# Altium footprint library MyComponents_v2.5.PcbLib: 403 footprints (part 25 of 26)
Each footprint in its own frame and in the unit in brackets; x right, y up, seen from the top. Pads: shape width x height; smd on the part's side, far side on the other; paste and mask are expansions set on the pad; w line width, h text height; cw(c..) or ccw(c..) is an arc to the next point about the centre after c.
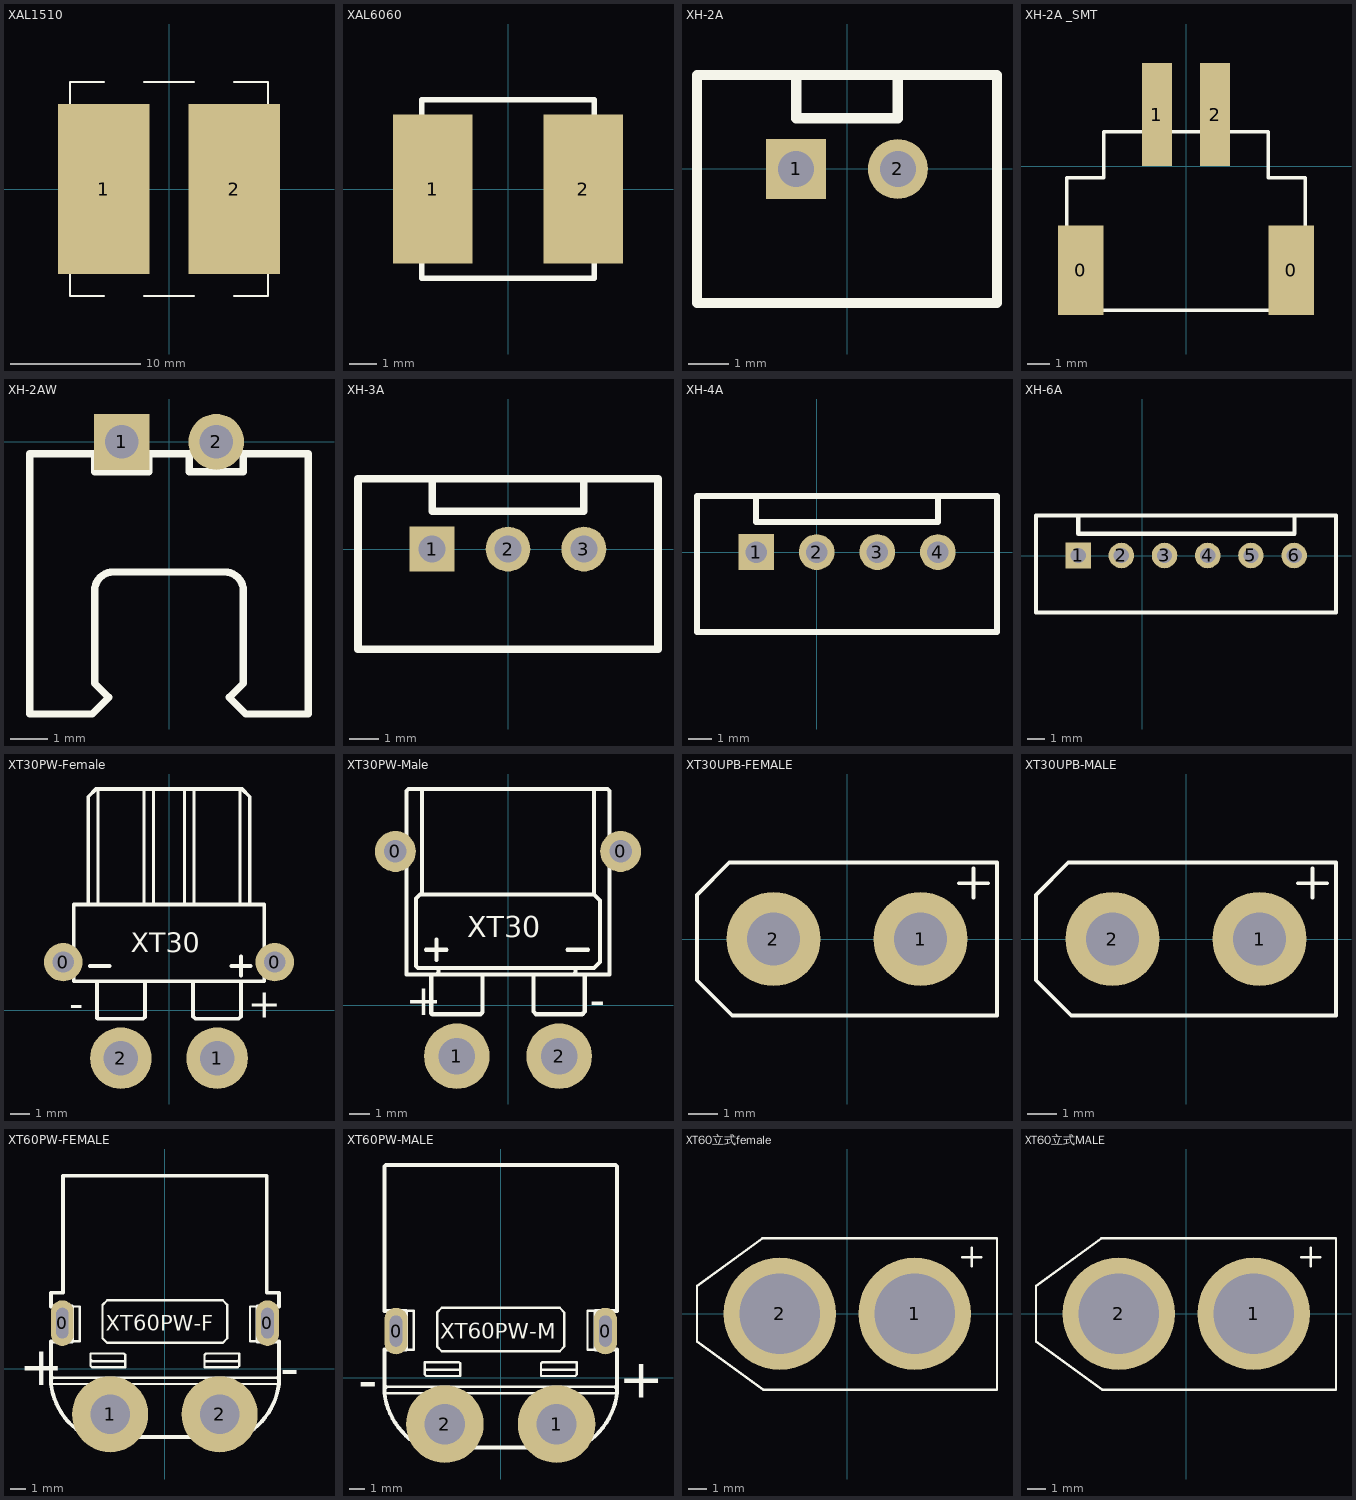
[diagram p24: the footprints below, top view; thin cyan lines are the x and y axes]

## XAL1510 [mm]
pads (2):
  rect 7x13 smd: 1(-5,0) 2(5,0)
Top Overlay:
  lines w0.152: -5,-8.2 -7.6,-8.2 -7.6,8.2 -5,8.2 ; -1.919,-8.2 1.919,-8.2 ; -1.919,8.2 1.919,8.2 ; 5,-8.2 7.6,-8.2 7.6,8.2 5,8.2
3D body "Coilcraft-XAL1510-103.step": height 10, standoff 0, extent -7.7,-8.2 7.7,8.2

## XAL6060 [mm]
pads (2):
  rect 2.93x5.5 smd: 1(-2.77,0) 2(2.77,0)
Top Overlay:
  lines w0.2: -3.18,-3.28 -3.18,3.28 3.18,3.28 3.18,-3.28 -3.18,-3.28
3D body "XAL6060.step": height 6, standoff -0.1, extent -3.28,-3.38 3.28,3.38

## XH-2A [mm] "2A,2.54mm"
pads (2):
  rect 1.5x1.5 hole 0.9: 1(-1.27,0)
  round 1.5 hole 0.9: 2(1.27,0)
Top Overlay:
  lines w0.254: -1.27,2.35 -1.27,1.27 1.27,1.27 1.27,2.35 ; -3.75,-3.35 3.75,-3.35 3.75,2.35 -3.75,2.35 -3.75,-3.35
3D body "XH2_54_2PIN.step": height 7.01, standoff -1.99, extent -4,-3.2 4,2.8

## XH-2A _SMT [mm] "2A,2.54mm smt"
pads (4):
  rect 2x3.9 smd: 0(-4.6,-4.55) 0(4.6,-4.55)
  rect 1.3x4.5 smd: 1(-1.27,2.25) 2(1.27,2.25)
Top Overlay:
  lines w0.15: -5.2,-6.3 -5.2,-0.5 -3.6,-0.5 -3.6,1.5 0,1.5 3.6,1.5 3.6,-0.5 5.2,-0.5 5.2,-6.3 0,-6.3 -5.2,-6.3
3D body "XH2.54AWR-2P.STEP": height 6.13, standoff -0.03, extent -4.9,-6.275 5.1,4.065

## XH-2AW [mm] "2A,2.54mm"
pads (2):
  rect 1.5x1.5 hole 0.9: 1(-1.27,0)
  round 1.5 hole 0.9: 2(1.27,0)
Top Overlay:
  lines w0.2: -2,-0.35 -2,-0.8 -0.775,-0.8 -0.55,-0.8 -0.55,-0.325 0,-0.325 0.55,-0.325 0.55,-0.8 0.775,-0.8 2,-0.8 2,-0.35 ; -1.955,-0.32 -3.75,-0.32 -3.75,-7.32 -2.07,-7.32 -1.625,-6.875 -2,-6.5 ; 1.955,-0.32 3.75,-0.32 3.75,-7.32 2.07,-7.32 1.625,-6.875 2,-6.5 ; -2,-6.5 -2,-4 cw(c-1.5,-4) -1.5,-3.5 0.5,-3.5 1.5,-3.5 cw(c1.5,-4) 2,-4 2,-6.5 ; -2,-6.5 -2,-6.5 ; -2,-6.5 -2,-6.5 ; 2,-6.5 2,-6.5 ; 2,-6.5 2,-6.5

## XH-3A [mm] "3A,2.54mm"
pads (3):
  rect 1.5x1.5 hole 0.9: 1(-2.54,0)
  round 1.5 hole 0.9: 2(0,0) 3(2.54,0)
Top Overlay:
  lines w0.254: -2.54,2.35 -2.54,1.27 2.54,1.27 2.54,2.35 ; -5.02,-3.35 5.02,-3.35 5.02,2.35 -5.02,2.35 -5.02,-3.35

## XH-4A [mm] "4A,2.54mm"
pads (4):
  rect 1.5x1.5 hole 0.9: 1(-2.54,0)
  round 1.5 hole 0.9: 2(0,0) 3(2.54,0) 4(5.08,0)
Top Overlay:
  lines w0.254: -2.54,2.35 -2.54,1.27 5.08,1.27 5.08,2.35 ; -5.02,-3.35 7.56,-3.35 7.56,2.35 -5.02,2.35 -5.02,-3.35

## XH-6A [mm]
pads (6):
  rect 1.5x1.5 hole 0.9: 1(-3.759,0.025)
  round 1.5 hole 0.9: 2(-1.219,0.025) 3(1.321,0.025) 4(3.861,0.025) 5(6.401,0.025) 6(8.941,0.025)
Top Overlay:
  lines w0.254: -3.759,2.375 -3.759,1.295 8.966,1.295 8.966,2.375 ; -6.239,-3.325 11.405,-3.325 11.405,2.375 -6.239,2.375 -6.239,-3.325

## XT30PW-Female [mm] "XT30卧式母头插座"
height 5
pads (4):
  round 2 hole 1.1: 0(-5.5,2.5) 0(5.5,2.5)
  round 3.2 hole 1.8: 1(2.5,-2.5) 2(-2.5,-2.5)
Top Overlay:
  lines w0.15: -3.7,5.5 -3.7,11.5 ; -1.3,5.6 -1.3,11.5 ; -0.8,5.5 -0.8,11.5 ; 0.8,5.5 0.8,11.5 ; 1.3,5.5 1.3,11.5 ; 3.6,11.5 3.7,11.4 3.7,5.5
  lines w0.2: -4.2,5.5 -4.2,11.1 -3.8,11.5 3.8,11.5 4.2,11.1 4.2,5.5 ; -4.1,2.3 -3.1,2.3 ; -3.75,1.5 -3.75,-0.4 -3.7,-0.45 -1.35,-0.45 -1.25,-0.35 -1.25,1.5 ; 1.25,1.4 1.25,-0.325 1.375,-0.45 3.625,-0.45 3.75,-0.325 3.75,1.5 ; 3.25,2.3 4.25,2.3 ; 3.75,1.8 3.75,2.8 ; -4.95,1.5 -4.95,5.5 4.95,5.5 4.95,1.5 -4.95,1.5
  text "+" at 4.1,-0.4 h1.52
  text "-" at -5.2,-0.4 h1.52
  text "XT30" at -2,3 h1.02
3D body "XT30PW-F-.step": height 5, standoff -2, extent -6.65,-3.575 6.65,11.325

## XT30PW-Male [mm] "XT30卧式公头插座"
height 5
pads (4):
  round 2 hole 1.1: 0(-5.5,7.5) 0(5.5,7.5)
  round 3.2 hole 1.8: 1(-2.5,-2.5) 2(2.5,-2.5)
Top Overlay:
  lines w0.2: -4.2,5.4 -4.2,10.55 ; -4,2.7 -3,2.7 ; -3.75,1.5 -3.75,-0.4 -3.7,-0.45 -1.35,-0.45 -1.25,-0.35 -1.25,1.5 ; -3.5,1.5 -3.4,1.6 -3.4,1.8 ; -3.5,2.2 -3.5,3.2 ; 1.25,1.4 1.25,-0.325 1.375,-0.45 3.625,-0.45 3.75,-0.325 3.75,1.5 ; 2.9,2.7 3.9,2.7 ; 3.2,1.5 3.3,1.6 3.3,1.8 ; 4.2,5.5 4.2,10.55 ; -4.95,1.5 -4.95,10.45 -4.85,10.55 4.85,10.55 4.95,10.45 4.95,1.5 -4.95,1.5 ; -4.5,1.9 -4.5,5.2 -4.3,5.4 4.2,5.4 4.5,5.1 4.5,2.1 4.2,1.8 -4.4,1.8 -4.5,1.9
  text "-" at 4,-0.5 h1.52
  text "+" at -5,-0.5 h1.52
  text "XT30" at -2,3.3 h1.02
3D body "XT30PW-M-.step": height 5, standoff -2, extent -6.65,-3.4 6.65,10.55

## XT30UPB-FEMALE [mm]
pads (2):
  round 3.2 hole 1.8: 1(2.5,0) 2(-2.5,0)
Top Overlay:
  lines w0.127: 3.8,1.9 4.8,1.9 ; 4.3,1.4 4.3,2.4 ; -5.1,-1.4 -5.1,1.5 -4,2.6 5.1,2.6 5.1,-2.6 -3.9,-2.6 -5.1,-1.4
3D body "XT30UPB.STEP": height 10, standoff -2.2, extent -4.95,-2.489 5.05,2.511

## XT30UPB-MALE [mm]
pads (2):
  round 3.2 hole 1.8: 1(2.5,0) 2(-2.5,0)
Top Overlay:
  lines w0.127: 3.8,1.9 4.8,1.9 ; 4.3,1.4 4.3,2.4 ; -5.1,-1.4 -3.9,-2.6 5.1,-2.6 5.1,2.6 -4,2.6 -5.1,1.5 -5.1,-1.4
3D body "XT30UPB-M.STEP": height 10.7, standoff -2, extent -5.1,-2.6 5.1,2.6

## XT60PW-FEMALE [mm] "XT60卧式母头插座"
pads (4):
  oval 1.5x3 hole 0.8 slot 2 at 90 deg: 0(-6.75,3) 0(6.75,3)
  round 5 hole 2.6: 1(-3.6,-3) 2(3.6,-3)
Top Overlay:
  lines w0.15: -7.4,-0.6 -7.5,-0.5 -7.5,-1 ; -6.1,1.8 -5.6,1.8 -5.6,4.1 -6.1,4.1 ; -4.9,0.6 -4.8,0.5 -2.6,0.5 ; 2.6,0.5 4.8,0.5 4.9,0.6 ; 6.1,1.8 5.6,1.8 5.6,4.1 6.1,4.1 ; -7.5,-1 -7.5,-0.6 7.4,-0.6 7.5,-0.5 7.5,-1 -7.5,-1 ; -7.5,-1 -7.5,-1 ; -4.9,0.2 -4.9,1 -2.7,1 -2.6,0.9 -2.6,0.1 -4.8,0.1 -4.9,0.2 ; -4.1,2 -3.8,1.7 0,1.7 3.8,1.7 4.1,2 4.1,4.2 3.8,4.5 0,4.5 -3.8,4.5 -4.1,4.2 -4.1,2 ; 2.6,0.1 2.6,0.9 2.7,1 4.9,1 4.9,0.2 4.8,0.1 2.6,0.1
  lines w0.25: -7.4,-0.6 -7.5,-0.5 ; 7.4,-0.6 7.5,-0.5 ; -7.5,-1 ccw(c-3.048,-0.463) -5,-4.5 ; -7.5,-1 ccw(c-3.048,-0.463) -5,-4.5 ; -7.5,-1 -7.5,-0.5 ; -7.5,-1 -7.5,-1 ; -7.5,-0.5 -7.5,1.8 -6.1,1.8 -6.1,4.1 -7.5,4.1 -7.5,5 -6.7,5 -6.7,12.7 0,12.7 6.7,12.7 6.7,5 7.5,5 7.5,4.1 6.1,4.1 6.1,1.8 7.5,1.8 7.5,-0.5 ; -5,-4.5 5,-4.5 ccw(c3.048,-0.463) 7.5,-1 ; 7.5,-1 7.5,-1 ; 7.5,-1 7.5,-0.5
  text "+" at -9.6,-1.1 h2.54
  text "-" at 7.6,-1.2 h2.54
  text "XT60PW-F" at -3.9,2.5 h1.02

## XT60PW-MALE [mm] "XT60卧式公头插座"
pads (4):
  oval 1.5x3 hole 0.8 slot 2 at 90 deg: 0(-6.75,3) 0(6.75,3)
  round 5 hole 2.6: 1(3.6,-3) 2(-3.6,-3)
Top Overlay:
  lines w0.15: -7.4,-0.6 -7.5,-0.5 -7.5,-1 ; -6.1,1.8 -5.6,1.8 -5.6,4.3 -6.1,4.3 ; -4.9,0.6 -4.8,0.5 -2.6,0.5 ; 2.6,0.5 4.8,0.5 4.9,0.6 ; 6.1,1.8 5.6,1.8 5.6,4.3 6.1,4.3 ; -7.5,-1 7.5,-1 7.5,-0.5 7.4,-0.6 -7.5,-0.6 -7.5,-1 ; -7.5,-1 -7.5,-1 ; -4.9,0.2 -4.8,0.1 -2.6,0.1 -2.6,0.9 -2.7,1 -4.9,1 -4.9,0.2 ; -4.1,2 -4.1,4.2 -3.8,4.5 0,4.5 3.8,4.5 4.1,4.2 4.1,2 3.8,1.7 0,1.7 -3.8,1.7 -4.1,2 ; 2.6,0.1 4.8,0.1 4.9,0.2 4.9,1 2.7,1 2.6,0.9 2.6,0.1
  lines w0.25: -7.4,-0.6 -7.5,-0.5 ; 7.4,-0.6 7.5,-0.5 ; -7.5,-1 ccw(c-3.048,-0.463) -5,-4.5 ; -7.5,-1 ccw(c-3.048,-0.463) -5,-4.5 ; -7.5,-1 -7.5,-1 ; -7.5,-1 -7.5,-0.5 ; -7.5,-0.5 -7.5,1.8 -6.1,1.8 -6.1,4.3 -7.5,4.3 -7.5,13.6 ; -7.5,13.6 -7.4,13.7 ; -7.5,13.6 -7.4,13.7 ; -7.4,13.7 0,13.7 ; -7.4,13.7 0,13.7 ; -5,-4.5 5,-4.5 ccw(c3.048,-0.463) 7.5,-1 ; 0,13.7 7.4,13.7 7.5,13.6 7.5,4.3 6.1,4.3 6.1,1.8 7.5,1.8 7.5,-0.5 ; 7.5,-1 7.5,-0.5 ; 7.5,-1 7.5,-1
  text "XT60PW-M" at -3.9,2.5 h1.02
  text "+" at 7.6,-1.3 h2.54
  text "-" at -9.2,-1.4 h2.54

## XT60立式female [mm] "输出"
pads (2):
  round 6 hole 4.3: 1(3.6,0) 2(-3.6,0)
Top Overlay:
  lines w0.127: 6.15,3.025 7.15,3.025 ; 6.65,2.525 6.65,3.525 ; -8.025,-1.474 -4.5,-4.05 8,-4.05 8,4.025 -4.534,4.025 -8.025,1.474 -8.025,-1.474
3D body "XT60.step": height 16.87, standoff -5.13, extent -7.993,-4.064 7.942,4.064

## XT60立式MALE [mm] "输入"
pads (2):
  round 6 hole 4.3: 1(3.6,0) 2(-3.6,0)
Top Overlay:
  lines w0.127: 6.15,3.025 7.15,3.025 ; 6.65,2.525 6.65,3.525 ; -8.025,-1.474 -8.025,1.474 -4.534,4.025 8,4.025 8,-4.05 -4.5,-4.05 -8.025,-1.474
3D body "XT60 male.step": height 16, standoff -5.2, extent -7.95,-4.1 7.95,4.05